# Altium schematic symbol library LimeMicroAltiumLib_schLib_r05.SchLib: 582 symbols (part 4 of 13) (continued)
## 5CGXFC7D7F31C8N (continued)
part I pins: AB3 GXB_TX_L2n (out), AB4 GXB_TX_L2p (out), AC1 GXB_RX_L2n, GXB_REFCLK_L2n (in), AC2 GXB_RX_L2p, GXB_REFCLK_L2p (in), AD3 GXB_TX_L1n (out), AD4 GXB_TX_L1p (out), AE1 GXB_RX_L1n, GXB_REFCLK_L1n (in), AE2 GXB_RX_L1p, GXB_REFCLK_L1p (in), AF3 GXB_TX_L0n (out), AF4 GXB_TX_L0p (out), AG1 GXB_RX_L0n, GXB_REFCLK_L0n (in), AG2 GXB_RX_L0p, GXB_REFCLK_L0p (in), W7 REFCLK0Ln (in), W8 REFCLK0Lp (in)
part J pins: AA1 GXB_RX_L3n, GXB_REFCLK_L3n (in), AA2 GXB_RX_L3p, GXB_REFCLK_L3p (in), R7 REFCLK1Ln (in), R8 REFCLK1Lp (in), T3 GXB_TX_L5n (out), T4 GXB_TX_L5p (out), U1 GXB_RX_L5n, GXB_REFCLK_L5n (in), U2 GXB_RX_L5p, GXB_REFCLK_L5p (in), V3 GXB_TX_L4n (out), V4 GXB_TX_L4p (out), W1 GXB_RX_L4n, GXB_REFCLK_L4n (in), W2 GXB_RX_L4p, GXB_REFCLK_L4p (in), Y3 GXB_TX_L3n (out), Y4 GXB_TX_L3p (out)
part K pins: K3 GXB_TX_L8n (out), K4 GXB_TX_L8p (out), L1 GXB_RX_L8n, GXB_REFCLK_L8n (in), L2 GXB_RX_L8p, GXB_REFCLK_L8p (in), M3 GXB_TX_L7n (out), M4 GXB_TX_L7p (out), N1 GXB_RX_L7n, GXB_REFCLK_L7n (in), N2 GXB_RX_L7p, GXB_REFCLK_L7p (in), N7 REFCLK2Ln (in), P3 GXB_TX_L6n (out), P4 GXB_TX_L6p (out), P8 REFCLK2Lp (in), R1 GXB_RX_L6n, GXB_REFCLK_L6n (in), R2 GXB_RX_L6p, GXB_REFCLK_L6p (in)
part L pins: AA7 nCSO, DATA4 (out), AB7 AS_DATA3, DATA3 (io), AC7 TCK (in), AE5 AS_DATA1, DATA1 (io), AE7 AS_DATA2, DATA2 (io), AG5 AS_DATA0, ASDO, DATA0 (io), C5 nCONFIG (in), G5 MSEL2 (in), H6 nCE (in), K7 nSTATUS (io), L8 CONF_DONE (io), M7 MSEL4 (in), P7 MSEL3 (in), P9 MSEL1 (in), T7 DCLK (io), T8 MSEL0 (in), U7 TDI (in), V7 TMS (in), W9 TDO (out)
part M pins: A7 VCCIO8A (power), A22 VCCIO7A (power), AA12 VCCIO3B (power), AA22 VCCIO5A (power), AB15 VCCIO4A (power), AB25 VCCIO5A (power), AC8 VCCIO3A (power), AC18 VCCIO4A (power), AC28 VCCIO5B (power), AD11 VCCIO3A (power), AD21 VCCIO4A (power), AE14 VCCIO3B (power), AE24 VCCIO5A (power), AF17 VCCIO4A (power), AF27 VCCIO5A (power), AG10 VCCIO3B (power), AG20 VCCIO4A (power), AG30 VCCIO5B (power), AH13 VCCIO3B (power), AH23 VCCIO4A (power), AJ16 VCCIO4A (power), AJ26 VCCIO4A (power), AK4 VCCIO3B (power), AK9 VCCIO3B (power), AK19 VCCIO4A (power), B5 VCCIO8A (power), B15 VCCIO7A (power), B25 VCCIO7A (power), C8 VCCIO8A (power), C18 VCCIO7A (power), C28 VCCIO6A (power), D11 VCCIO8A (power), D21 VCCIO7A (power), E14 VCCIO8A (power), E24 VCCIO7A (power), F7 VCCIO8A (power), F17 VCCIO7A (power), F27 VCCIO6A (power), G10 VCCIO8A (power), G20 VCCIO7A (power), G30 VCCIO6A (power), H13 VCCIO8A (power), H23 VCCIO7A (power), J16 VCCIO8A (power), J26 VCCIO6A (power), K19 VCCIO7A (power), K29 VCCIO6A (power), L12 VCCIO8A (power), L22 VCCIO6A (power), M13 VCC (power), M15 VCC (power), M17 VCC (power), M19 VCC (power), M25 VCCIO6A (power), N14 VCC (power), N16 VCC (power), N18 VCC (power), N28 VCCIO6A (power), P13 VCC (power), P15 VCC (power), P17 VCC (power), P19 VCC (power), P21 VCCIO6A (power), R14 VCC (power), R16 VCC (power), R18 VCC (power), R24 VCCIO6A (power), T13 VCC (power), T15 VCC (power), T17 VCC (power), T19 VCC (power), T27 VCCIO5B (power), U10 VCCIO3A (power), U14 VCC (power), U16 VCC (power), U18 VCC (power), U20 VCC (power), U30 VCCIO5B (power), V13 VCC (power), V15 VCC (power), V17 VCC (power), V19 VCC (power), W14 VCC (power), W16 VCC (power), W18 VCC (power), W20 VCC (power), W26 VCCIO5B (power), Y9 VCCIO3A (power), Y19 VCCIO4A (power), Y29 VCCIO5B (power)
part N pins: AA5 VCCE_GXBL (power), AB6 VCCH_GXBL (power), AB11 VCCPD3A (power), AB23 VCCA_FPLL (power), AB24 VCCPGM (power), AC5 VCCL_GXBL (power), AC10 VCC_AUX (power), AC11 VCCPGM (power), AC12 VCCPD3B4A (power), AC16 VCC_AUX (power), AC17 VCCPD3B4A (power), AC20 VCCPD3B4A (power), AC25 VREFB5AN0 (power), AD6 VCCE_GXBL (power), AD10 VCCPD3A (power), AD15 VCCPD3B4A (power), AD22 VCC_AUX (power), AE8 VREFB3AN0 (power), AE11 VCCPD3B4A (power), AE21 VCCPD3B4A (power), AH16 VREFB4AN0 (power), AJ13 VREFB3BN0 (power), B9 VREFB8AN0 (power), B16 VREFB7AN0 (power), D24 VCCPD7A8A (power), F10 VCCPGM (power), F11 VCCPD7A8A (power), F21 VCCPD7A8A (power), F23 VCCPD7A8A (power), G11 VCC_AUX (power), G13 VCCPD7A8A (power), G16 VCCPD7A8A (power), G19 VCCPD7A8A (power), H10 VCCBAT (power), H16 VCC_AUX (power), H22 VCC_AUX (power), J5 VCCE_GXBL (power), J8 VCCA_FPLL (power), J24 VCCA_FPLL (power), K6 VCCH_GXBL (power), K23 VCCPD6A (power), L5 VCCL_GXBL (power), M6 VCCE_GXBL (power), M24 VCCPD6A (power), M26 VREFB6AN0 (power), N5 VCCE_GXBL (power), P6 VCCH_GXBL (power), P24 VCCPD6A (power), P27 VREFB5BN0 (power), R5 VCCL_GXBL (power), T6 VCCE_GXBL (power), T26 VCCPD5B (power), U5 VCCE_GXBL (power), U24 VCCPD5B (power), V6 VCCH_GXBL (power), W5 VCCL_GXBL (power), W23 VCCPD5A (power), W25 VCCPD5A (power), Y6 VCCE_GXBL (power), Y8 VCCA_FPLL (power)
part O pins: A12 GND (power), A17 GND (power), A27 GND (power), AA3 GND (power), AA4 GND (power), AA6 GND (power), AA17 GND (power), AA27 GND (power), AB1 GND (power), AB2 GND (power), AB5 GND (power), AB10 GND (power), AB20 GND (power), AB30 GND (power), AC3 GND (power), AC4 GND (power), AC6 GND (power), AC13 GND (power), AC23 GND (power), AD1 GND (power), AD2 GND (power), AD5 GND (power), AD7 GND (power), AD16 GND (power), AD26 GND (power), AE3 GND (power), AE4 GND (power), AE6 GND (power), AE9 GND (power), AE19 GND (power), AE29 GND (power), AF1 GND (power), AF2 GND (power), AF5 GND (power), AF12 GND (power), AF22 GND (power), AG3 GND (power), AG4 GND (power), AG15 GND (power), AG25 GND (power), AH1 GND (power), AH2 GND (power), AH3 GND (power), AH8 GND (power), AH18 GND (power), AH28 GND (power), AJ6 GND (power), AJ11 GND (power), AJ21 GND (power), AK2 GND (power), AK14 GND (power), AK24 GND (power), AK29 GND (power), B1 GND (power), B2 GND (power), B10 GND (power), B20 GND (power), B30 GND (power), C2 GND (power), C3 GND (power), C4 GND (power), C13 GND (power), C23 GND (power), D1 GND (power), D2 GND (power), D5 GND (power), D16 GND (power), D26 GND (power), E3 GND (power), E4 GND (power), E5 GND (power), E9 GND (power), E19 GND (power), E29 GND (power), F1 GND (power), F2 GND (power), F5 GND (power), F12 GND (power), F22 GND (power), G3 GND (power), G4 GND (power), G15 GND (power), G24 GND (power), G25 GND (power), H1 GND (power), H2 GND (power), H5 GND (power), H8 GND (power), H11 GND (power), H18 GND (power), H28 GND (power), J3 GND (power), J4 GND (power), J6 GND (power), J11 GND (power), J21 GND (power), K1 GND (power), K2 GND (power), K5 GND (power), K9 GND (power), K14 GND (power), K24 GND (power), L3 GND (power), L4 GND (power), L6 GND (power), L17 GND (power), L27 GND (power), M1 GND (power), M2 GND (power), M5 GND (power), M10 GND (power), M14 GND (power), M16 GND (power), M18 GND (power), M20 GND (power), M30 GND (power), N3 GND (power), N4 GND (power), N6 GND (power), N8 GND (power), N13 GND (power), N15 GND (power), N17 GND (power), N19 GND (power), N23 GND (power), P1 GND (power), P2 GND (power), P5 GND (power), P11 GND (power), P14 GND (power), P16 GND (power), P18 GND (power), P26 GND (power), R3 GND (power), R4 GND (power), R6 GND (power), R9 GND (power), R13 GND (power), R15 GND (power), R17 GND (power), R19 GND (power), R29 GND (power), T1 GND (power), T2 GND (power), T5 GND (power), T12 GND (power), T14 GND (power), T16 GND (power), T18 GND (power), T20 GND (power), T22 GND (power), U3 GND (power), U4 GND (power), U6 GND (power), U13 GND (power), U15 GND (power), U17 GND (power), U19 GND (power), U25 GND (power), V1 GND (power), V2 GND (power), V5 GND (power), V8 GND (power), V14 GND (power), V16 GND (power), V18 GND (power), V20 GND (power), V23 GND (power), V28 GND (power), W3 GND (power), W4 GND (power), W6 GND (power), W11 GND (power), W13 GND (power), W15 GND (power), W17 GND (power), W19 GND (power), W21 GND (power), Y1 GND (power), Y2 GND (power), Y5 GND (power), Y7 GND (power), Y14 GND (power), Y24 GND (power)
part P pins: AD8 DNU, AD14 DNU, B3 DNU, B4 DNU, C1 RREF_TL, D3 NC, D4 NC, D15 DNU, E1 NC, E2 NC, F3 NC, F4 NC, F24 DNU, G1 NC, G2 NC, H3 NC, H4 NC, J1 NC, J2 NC, K8 NC, L7 NC
part A text: BANK 3A
part B text: BANK 3B
part C text: BANK 4A
part D text: BANK 5A
part E text: BANK 5B
part F text: BANK 6A
part G text: BANK 7A
part H text: BANK 8A

## 8X_resistor_array_0402
designator R?, comment ResistorArray_0402
Manufacturer: PANASONIC ELECTRONIC COMPONENTS; Manufacturer Part Number: EXB2HV510JV; Supplier: Farnell; Supplier Part Number 1: 2060069RL
footprint EXB2HV (Chip Array, Flat, 16-Leads, Pitch 0,50mm,  Body 3,80x1,60mm,  IPC Medium Density)
pins: 1, 2, 3, 4, 5, 6, 7, 8, 9, 10, 11, 12, 13, 14, 15, 16

## 10M16SAU169C8G
designator IC?
Manufacturer: Altera; Number of LABs/CLBs: 1000; Number of Logic Elements/Cells: 16000; Total RAM Bits: 562176; Number of I/O: 130; Voltage - Supply: 2.85 V ~ 3.465 V; Supplier 1: Digi-Key; RoHS: RoHS Compliant; Number of Gates: -; Mounting Type: Surface Mount; Operating Temperature: 0°C ~ 85°C (TJ); Package / Case: 169-LFBGA; Supplier Device Package: 169-UBGA (11x11); Category: Integrated Circuits (ICs); Manufacturer Part Number 1: 10M16SAU169C8G; Supplier Part Number 1: 544-3110-ND
footprint 10M16SAU169C8G (BGA, 169-Leads, Body 11,00x11,00mmx1,55mm, Pitch 0,80mm)
part A pins: B1 DIFFOUT_L5p (io), C1 DIFFOUT_L5n (io), C2 DIFFOUT_L1p (io), D1 DIFFOUT_L1n (io), E1 DIFFOUT_L7p (io), E3 DIFFOUT_L3n (io), E4 DIFFOUT_L3p (io), E5 JTAGEN (io), F1 DIFFOUT_L7n (io), F4 DIFFOUT_L14n (io), F5 TDI, DIFFOUT_L12n (io), F6 TDO, DIFFOUT_L12p (io), G1 TMS, DIFFOUT_L11n (io), G2 TCK, DIFFOUT_L11p (io), G4 DIFFOUT_L14p (io), H1 I/O (io), H2 DIFFOUT_L16n (io), H3 DIFFOUT_L16p (io)
part B pins: G5 CLK0n, DIFFOUT_L20n (io), H4 CLK1p, DIFFOUT_L22p (io), H5 CLK1n, DIFFOUT_L22n (io), H6 CLK0p, DIFFOUT_L20p (io), J1 DIFFOUT_L21n (io), J2 DIFFOUT_L21p (io), K1 DIFFOUT_L32n (io), K2 DIFFOUT_L32p (io), L1 I/O (io), L2 I/O (io), L3 PLL_L_CLKOUTp, DIFFOUT_L31p (io), M1 DIFFOUT_L23n (io), M2 DIFFOUT_L23p (io), M3 PLL_L_CLKOUTn, DIFFOUT_L31n (io), N2 DPCLK0, DIFFOUT_L24n (io), N3 DPCLK1, DIFFOUT_L24p (io)
part C pins: J5 DIFFOUT_B3p (io), J6 DIFFOUT_B13n (io), J7 DIFFOUT_B15n (io), J8 CLK7n, DIFFOUT_B20n (io), K5 DIFFOUT_B3n (io), K6 DIFFOUT_B13p (io), K7 DIFFOUT_B15p (io), K8 CLK7p, DIFFOUT_B20p (io), L4 DIFFOUT_B1p (io), L5 DIFFOUT_B1n (io), L10 DIFFOUT_B22p (io), L11 CLK6p, DIFFOUT_B18p (io), M4 DIFFOUT_B2n (io), M5 DIFFOUT_B2p (io), M7 DIFFOUT_B5p (io), M8 DIFFOUT_B14n (io), M9 DIFFOUT_B14p (io), M10 DIFFOUT_B22n (io), M11 CLK6n, DIFFOUT_B18n (io), M12 DIFFOUT_B16p (io), M13 DIFFOUT_B16n (io), N4 DIFFOUT_B4n (io), N5 DIFFOUT_B4p (io), N6 DIFFOUT_B5n (io), N7 DIFFOUT_B6n (io), N8 DIFFOUT_B6p (io), N9 DIFFOUT_B17p (io), N10 DIFFOUT_B17n (io), N11 I/O (io), N12 I/O (io)
part D pins: G12 DIFFOUT_R15n (io), G13 DIFFOUT_R15p (io), H8 DIFFOUT_R14n (io), H9 DIFFOUT_R14p (io), H10 DIFFOUT_R12n (io), H13 DIFFOUT_R13n (io), J9 DIFFOUT_R12p (io), J10 DIFFOUT_R1n, RDN (io), J12 DIFFOUT_R11n (io), J13 DIFFOUT_R13p (io), K10 DIFFOUT_R1p, RUP (io), K11 DIFFOUT_R2p (io), K12 DIFFOUT_R11p (io), K13 I/O (io), L12 DIFFOUT_R2n (io), L13 I/O (io)
part E pins: A12 DIFFOUT_R34n (io), B11 DIFFOUT_R32n (io), B12 DIFFOUT_R32p (io), B13 DIFFOUT_R34p (io), C11 DIFFOUT_R33n (io), C12 DIFFOUT_R33p (io), C13 I/O (io), D9 DIFFOUT_R35n (io), D11 DIFFOUT_R37n (io), D12 DIFFOUT_R37p (io), D13 I/O (io), E9 DIFFOUT_R31n (io), E10 DIFFOUT_R35p (io), E12 DIFFOUT_R22n (io), E13 CLK3n, DIFFOUT_R20n (io), F8 DIFFOUT_R31p (io), F9 DPCLK3, DIFFOUT_R30p (io), F10 DPCLK2, DIFFOUT_R30n (io), F12 DIFFOUT_R22p (io), F13 CLK3p, DIFFOUT_R20p (io), G9 CLK2p, DIFFOUT_R18p (io), G10 CLK2n, DIFFOUT_R18n (io)
part F pins: A2 DIFFOUT_T38p (io), A3 DIFFOUT_T33n (io), A4 DIFFOUT_T33p (io), A5 I/O (io), A6 DIFFOUT_T31n (io), A7 DIFFOUT_T31p (io), A8 DIFFOUT_T27p (io), A9 DIFFOUT_T27n (io), A10 DIFFOUT_T29p (io), A11 DIFFOUT_T29n (io), B2 DIFFOUT_T38n (io), B3 DIFFOUT_T35p (io), B4 DIFFOUT_T35n (io), B5 DIFFOUT_T32n (io), B6 DIFFOUT_T32p (io), B7 VREFB8N0 (io), B9 DEV_CLRn, DIFFOUT_T28n (io), B10 DIFFOUT_T28p (io), C4 nSTATUS, DIFFOUT_T36p (io), C5 CONF_DONE, DIFFOUT_T36n (io), C9 CLK5n, DIFFOUT_T26n (io), C10 CLK5p, DIFFOUT_T26p (io), D6 CRC_ERROR, DIFFOUT_T34n (io), D7 CONFIG_SEL (io), D8 DEV_OE, DIFFOUT_T30p (io), E6 DIFFOUT_T34p (io), E7 nCONFIG (in), E8 DIFFOUT_T30n (io)
part G pins: A1 GND, A13 GND, B8 GND, C3 GND, D5 GND, E2 REFGND, E11 GND, F3 GND, G7 GND, H12 GND, J4 GND, L9 GND, M6 GND, N1 GND, N13 GND
part H pins: C6 VCCIO8, C7 VCCIO8, C8 VCCIO8, D2 ANAIN1, D3 ADC_VREF, D4 VCCA3, D10 VCCA2, F2 VCCIO1A, F7 VCC_ONE, F11 VCCIO6, G3 VCCIO1B, G6 VCC_ONE, G8 VCC_ONE, G11 VCCIO6, H7 VCC_ONE, H11 VCCIO5, J3 VCCIO2, J11 VCCIO5, K3 VCCIO2, K4 VCCA1, K9 VCCA4, L6 VCCIO3, L7 VCCIO3, L8 VCCIO3
part A text: BANK 1A; BANK 1B
part B text: BANK 2
part C text: BANK 3
part D text: BANK 5
part E text: BANK 6
part F text: BANK 8
part G text: GND BANK

## 12CWQ06FN_diode_array
designator D?, comment 12CWQ06FN
Part Description: Diode Array 1 Pair Common Cathode Schottky 60 V Surface Mount TO-252-3, DPak (2 Leads + Tab), SC-63; Manufacturer: Sangdest Microelectronics; Supplier 1: Digi-Key; Supplier Part Number 1: 1655-12CWQ06FNCT-ND; Manufacturer Part Number 1: 12CWQ06FN; Stock 1: 56408; Pricing 1: 1=0,70000, 10=0,61700, 100=0,47270, 500=0,37364, 1000=0,29892 (USD); RoHS: No
footprint 12CWQ06FN_diode_array_DPAK (Footprint not found)
pins: 1, 2, 3

## 12V_DC_FAN
designator FAN?, comment 12V DC FAN
Part Description: DC Fans DC FAN 60x20mm 12VDC Sleeve WIRE; Manfufacturer Part Number 1: FAD1-06020CSAW11; Manufacturer: Qualtek; .Checked PCB: AV; Supplier Part Number 1: 562-FAD1-06020CSAW11; Supplier 1: Mouser
footprint LD39100PUR
pins: 1 STANDS

## 24FC64F
designator IC?
Manufacturer Part Number 1: 24FC64F-I/ST; Manufacturer: Microchip Technology; Format - Memory: EEPROMs - Serial; Speed: 400kHz, 1MHz; Interface: I²C, 2-Wire Serial; Memory Type: EEPROM; Memory Size: 64K (8K x 8); Voltage - Supply: 1.7 V ~ 5.5 V; Supplier 1: Digi-Key; Packaging: Tube; Supplier Device Package: 8-TSSOP; Operating Temperature: -40°C ~ 85°C; RoHS: RoHS Compliant; Category: Integrated Circuits (ICs); Package / Case: 8-TSSOP (0.173", 4.40mm Width); Supplier Part Number 1: 24FC64F-I/ST-ND
footprint QPB9337_QFN32 (Footprint not found)
pins: 1 A0, 2 A1, 3 A2, 4 VSS, 5 SDA, 6 SCL, 7 WP, 8 VCC

## 24FC512
designator IC?
Manufacturer Part Number 1: 24FC512-I/ST; Manufacturer: Microchip Technology; Speed: 400kHz, 1MHz; Memory Type: EEPROM; Memory Size: 512K (64K x 8); Voltage - Supply: 1.7 V ~ 5.5 V; Interface: I²C, 2-Wire Serial; Format - Memory: EEPROMs - Serial; Supplier 1: Digi-Key; RoHS: RoHS Compliant; Packaging: Tube; Operating Temperature: -40°C ~ 85°C; Supplier Device Package: 8-TSSOP; Category: Integrated Circuits (ICs); Package / Case: 8-TSSOP (0.173", 4.40mm Width); Supplier Part Number 1: 24FC512-I/ST-ND
footprint ESD8472_X3DFN2
pins: 1 A0, 2 A1, 3 A2, 4 VSS, 5 SDA, 6 SCL, 7 WP, 8 VCC

## 74AHCT1G126SE-7_BUFFER_NON_INV
designator IC?, comment 74AHCT1G126SE-7
74LVC1G07SE-7 alternative; Part Description: Buffer, Non-Inverting 1 Element 1 Bit per Element 3-State Output SOT-353; Manufacturer: Diodes; Min Supply Voltage: 4.5V; Max Supply Voltage: 5.5V; Operating Supply Voltage: 5V; Number of Channels: 1; Propagation Delay: 11ns; Logic Function: Buffer,Inverting; Polarity: Non-Inverting; Low Level Output Current: 8mA; Operating Supply Current: 10uA; High Level Output Current: -8mA; Quiescent Current: 1uA; Output Type: 3-STATE,PUSH-PULL; Supplier 1: Digi-Key; Supplier Part Number 1: 74AHCT1G126SE-7DICT-ND; Manufacturer Part Number 1: 74AHCT1G126SE-7; Stock 1: 127290; Pricing 1: 1=0,27000, 10=0,22200, 25=0,18600, 100=0,11780, 250=0,09096, 500=0,07752, 1000=0,05271 (USD); RoHS: Yes; Mount: Surface Mount; Case/Package: SOT-353; Number of Pins: 5; Contact Plating: Tin,Matte; Min Operating Temperature: -40°C; Max Operating Temperature: 125°C; Number of Inputs: 1; Number of Outputs: 1; Packaging: Tape and Reel; Package Quantity: 3000; Number of Elements: 1; Number of Input Lines: 1; Number of Output Lines: 1; Number of Bits per Element: 1; Turn-On Delay Time: 11ns; Series: 74AHCT; Number of Functions: 1; Supply Voltage-Nom: 5.5V; Technology: CMOS; Radiation Hardening: No; REACH SVHC: No SVHC; Lead Free: Lead Free; RoHS Compliant: Yes; ComponentLink1URL: https://datasheet.ciiva.com/12256/74ahct1g126-80154-12256741.pdf?src-supplier=Mouser; ComponentLink1Description: https://datasheet.ciiva.com/12256/74ahct1g126-80154-12256741.pdf?src-supplier=Mouser; ComponentLink2URL: https://datasheet.ciiva.com/26949/getdatasheetpartid-792439-26949318.pdf?src-supplier=Verical; ComponentLink2Description: https://datasheet.ciiva.com/26949/getdatasheetpartid-792439-26949318.pdf?src-supplier=Verical; ComponentLink3URL: https://datasheet.ciiva.com/1832/74ahct1g126-1832523.pdf?src-supplier=Digi-Key; ComponentLink3Description: https://datasheet.ciiva.com/1832/74ahct1g126-1832523.pdf?src-supplier=Digi-Key; ComponentLink4URL: https://datasheet.ciiva.com/1832/74ahct1g126-1832524.pdf?src-supplier=Digi-Key; ComponentLink4Description: https://datasheet.ciiva.com/1832/74ahct1g126-1832524.pdf?src-supplier=Digi-Key; ComponentLink5URL: https://datasheet.ciiva.com/1154/74ahct1g126-1154309.pdf?src-supplier=Element14; ComponentLink5Description: https://datasheet.ciiva.com/1154/74ahct1g126-1154309.pdf?src-supplier=Element14
footprint 74AHCT1G126SE-7_BUFFER_SOT353
pins: 1 ON/NC (in), 2 A (in), 3 GND, 4 Y (out), 5 VCC (power)

## 74HC595BQ,115
designator IC?
Part Description: C 8BIT SHIFT REGISTER 16-DHVQFN; Manufacturer: Nexperia USA Inc.; Logic Type: Shift Register; Output Type: Tri-State; Number of Bits per Element: 8; Function: Serial to Parallel, Serial; Voltage - Supply: 2 V ~ 6 V; Supplier 1: Digi-Key; Manufacturer Part Number 1: 74HC595BQ,115; RoHS: RoHS Compliant; Category: Integrated Circuits (ICs); Stock 1: 15449; Pricing 1: 1=0.39, 10=0.32, 100=0.2175, 500=0.16316, 1000=0.12236 (USD); Packaging: Cut Tape (CT); Part Status: Active; Operating Temperature: -40°C ~ 125°C; Mounting Type: Surface Mount; Package / Case: 16-VFQFN Exposed Pad; Supplier Device Package: 16-DHVQFN (2.5x3.5); ComponentLink1URL: http://assets.nexperia.com/documents/data-sheet/74HC_HCT595.pdf; ComponentLink1Description: http://assets.nexperia.com/documents/data-sheet/74HC_HCT595.pdf; Supplier Part Number 1: 1727-3327-1-ND
footprint 74HC595BQ,115
pins: 1 Q1 (out), 2 Q2 (out), 3 Q3 (out), 4 Q4 (out), 5 Q5 (out), 6 Q6 (out), 7 Q7 (out), 8 GND, 9 Q7S (out), 10 ~{MR} (in), 11 SHCP (in), 12 STCP (in), 13 ~{OE} (in), 14 DS (in), 15 Q0 (out), 16 VCC (power), PAD

## 74LVC1G3157FZ4_SPDT_SW
designator IC?, comment 74LVC1G3157FZ4
Part Description: 1 Circuit IC Switch 2:1 10Ohm X2-DFN1410-6; Manufacturer: Diodes; Manufacturer Part Number 1: 74LVC1G3157FZ4-7; Number of Circuits: 1; On-State Resistance: 10R; -3db Bandwidth: 300MHz; Supplier 1: Digi-Key; Supplier Part Number 1: 74LVC1G3157FZ4-7DICT-ND; Stock 1: 158709; Pricing 1: 1=0,42000, 10=0,31200, 25=0,27320, 100=0,17670, 250=0,14628, 500=0,11702, 1000=0,08972, 2500=0,07802 (USD); RoHS: Yes; Number of Pins: 6; Min Operating Temperature: -40°C; Max Operating Temperature: 125°C; Packaging: Tape and Reel; RoHS Compliant: Yes; ComponentLink1URL: https://www.diodes.com/assets/Datasheets/74LVC1G3157.pdf?src-supplier=Digi-Key; ComponentLink1Description: https://www.diodes.com/assets/Datasheets/74LVC1G3157.pdf?src-supplier=Digi-Key; ComponentLink2URL: https://www.diodes.com/assets/product-showcases/74LVC3157-NPA-0516.pdf?src-supplier=Digi-Key; ComponentLink2Description: https://www.diodes.com/assets/product-showcases/74LVC3157-NPA-0516.pdf?src-supplier=Digi-Key
footprint 74LVC1G3157FZ4_SPDT_SW_DFN1410-6 (Footprint not found)
pins: 1 B1, 2 GND, 3 B0, 4 A, 5 VCC, 6 SEL

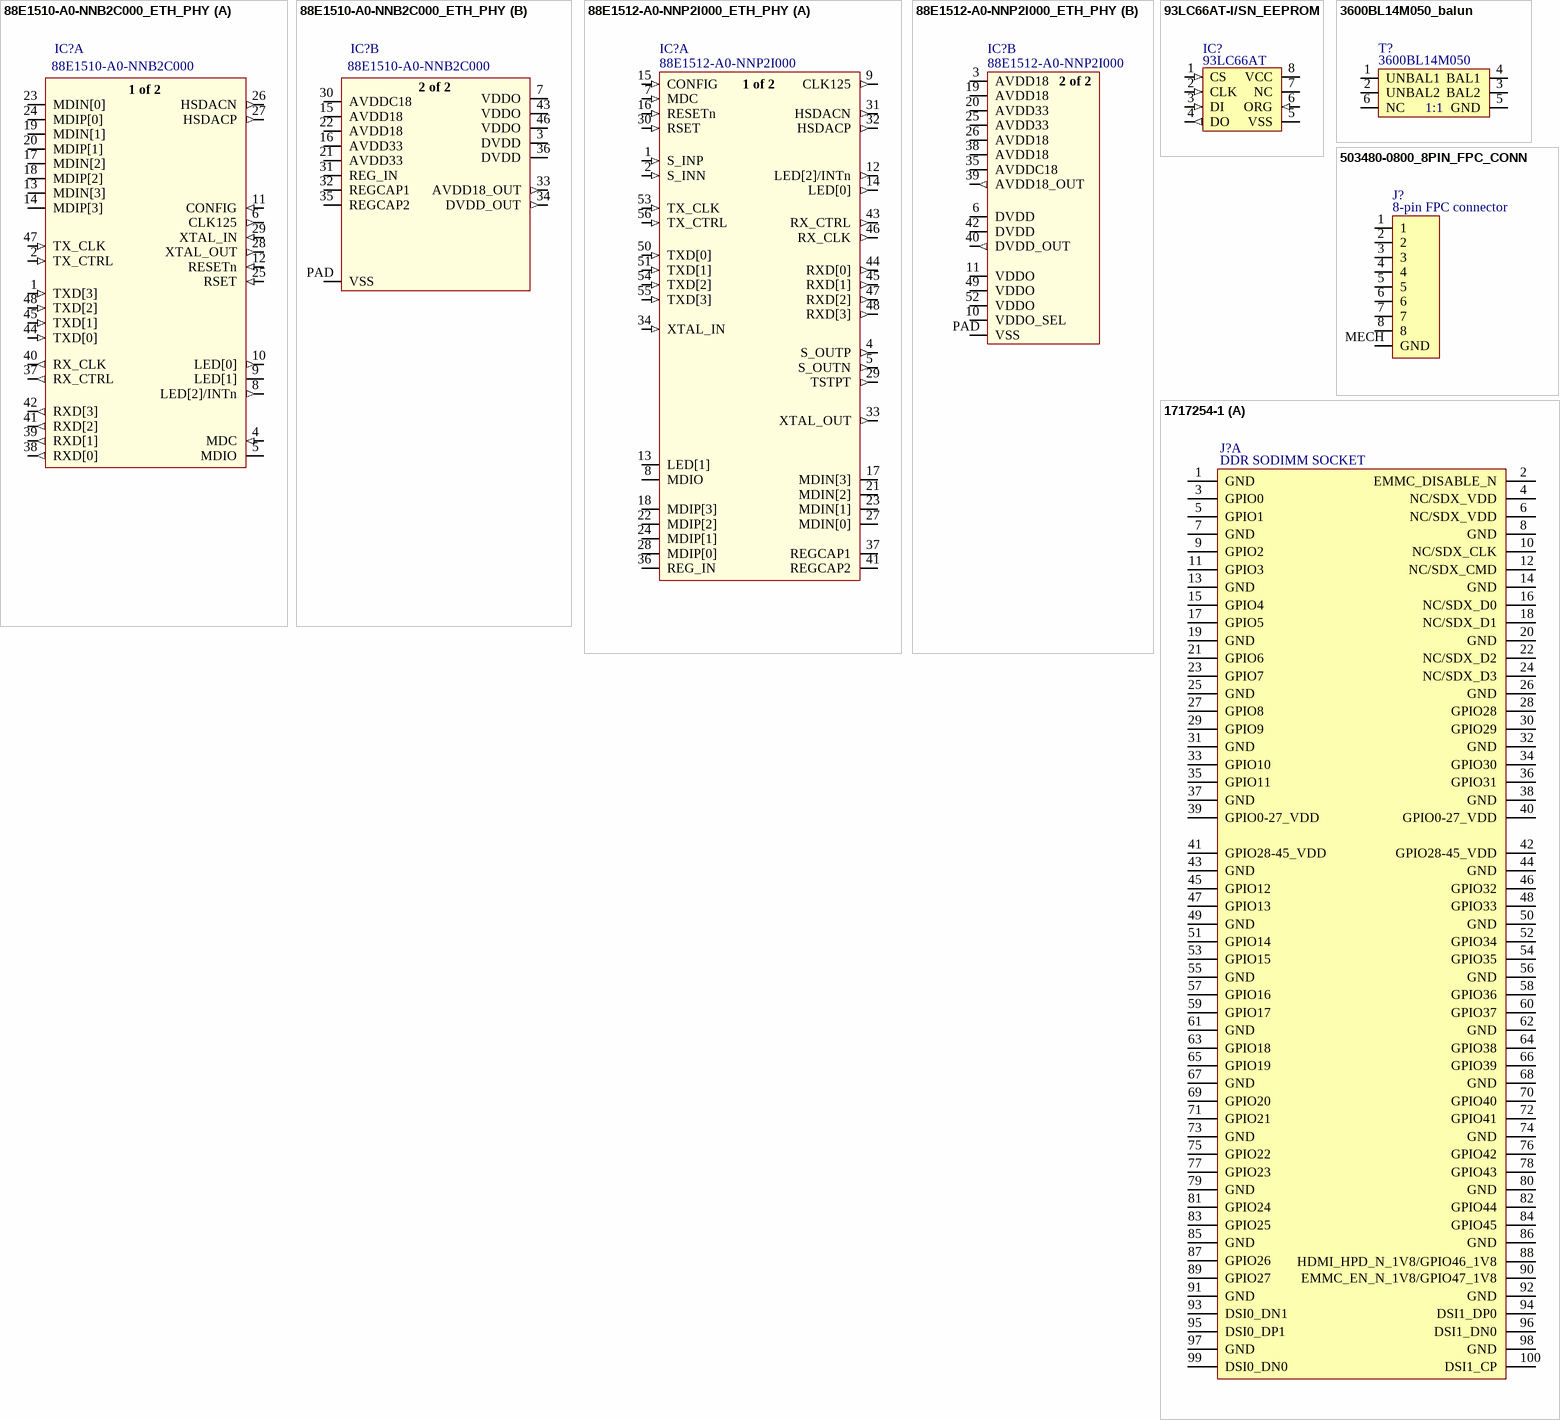
[diagram p20: symbols 88E1510-A0-NNB2C000_ETH_PHY to 1717254-1]

## 88E1510-A0-NNB2C000_ETH_PHY
designator IC?, comment 88E1510-A0-NNB2C000
Part Description: 4/4 Transceiver Full, Half IEEE 802.3, IEEE 1588 48-QFN (7x7); Manufacturer: Marvell; Supplier 1: Digi-Key; Supplier Part Number 1: 2208-88E1510-A0-NNB2C000-ND; Manufacturer Part Number 1: 88E1510-A0-NNB2C000; Stock 1: 1782; Pricing 1: 1=13,67000, 10=12,56100, 25=12,04040, 80=10,08800, 260=9,43719, 520=8,78635, 1040=8,59600 (USD); RoHS: Yes; RoHS Compliant: Yes
footprint 88E1510-A0-NNB2C000 _VQFN48 (Footprint not found)
part A pins: 1 TXD[3] (in), 2 TX_CTRL (in), 4 MDC (in), 5 MDIO (io), 6 CLK125 (out), 8 LED[2]/INTn (out), 9 LED[1] (io), 10 LED[0] (out), 11 CONFIG (in), 12 RESETn (in), 13 MDIN[3] (io), 14 MDIP[3] (io), 17 MDIN[2] (io), 18 MDIP[2] (io), 19 MDIN[1] (io), 20 MDIP[1] (io), 23 MDIN[0] (io), 24 MDIP[0] (io), 25 RSET (in), 26 HSDACN (out), 27 HSDACP (out), 28 XTAL_OUT (out), 29 XTAL_IN (in), 37 RX_CTRL (out), 38 RXD[0] (out), 39 RXD[1] (out), 40 RX_CLK (out), 41 RXD[2] (out), 42 RXD[3] (out), 44 TXD[0] (in), 45 TXD[1] (in), 47 TX_CLK (in), 48 TXD[2] (in)
part B pins: 3 DVDD (power), 7 VDDO (power), 15 AVDD18 (power), 16 AVDD33 (power), 21 AVDD33 (power), 22 AVDD18 (power), 30 AVDDC18 (power), 31 REG_IN, 32 REGCAP1 (io), 33 AVDD18_OUT (out), 34 DVDD_OUT (out), 35 REGCAP2 (io), 36 DVDD (power), 43 VDDO (power), 46 VDDO (power), PAD VSS
part A text: 1 of 2
part B text: 2 of 2

## 88E1512-A0-NNP2I000_ETH_PHY
designator IC?, comment 88E1512-A0-NNP2I000
Part Description: 4/4 Transceiver Full, Half IEEE 802.3, IEEE 1588 56-QFN (8x8); Manufacturer: Marvell; Number of Transceivers: 1; Supplier 1: Digi-Key; Supplier Part Number 1: 2208-88E1512-A0-NNP2I000-ND; Manufacturer Part Number 1: 88E1512-A0-NNP2I000; Stock 1: 6100; Pricing 1: 1=22,08000, 10=20,29400, 25=19,45320, 80=16,29850, 260=15,24704, 520=14,19552, 1040=13,45945 (USD); RoHS: Yes; Mount: Surface Mount; Min Operating Temperature: -40°C; Max Operating Temperature: 85°C; RoHS Compliant: Yes; ComponentLink1URL: http://www.marvell.com/transceivers/assets/Alaska_88E1512-001_product_brief.pdf?src-supplier=Avnet+Asia; ComponentLink1Description: http://www.marvell.com/transceivers/assets/Alaska_88E1512-001_product_brief.pdf?src-supplier=Avnet+Asia
footprint QFN56_MTG
part A pins: 1 S_INP (in), 2 S_INN (in), 4 S_OUTP (out), 5 S_OUTN (out), 7 MDC (in), 8 MDIO (io), 9 CLK125 (out), 12 LED[2]/INTn (out), 13 LED[1] (io), 14 LED[0] (out), 15 CONFIG (in), 16 RESETn (in), 17 MDIN[3] (io), 18 MDIP[3] (io), 21 MDIN[2] (io), 22 MDIP[2] (io), 23 MDIN[1] (io), 24 MDIP[1] (io), 27 MDIN[0] (io), 28 MDIP[0] (io), 29 TSTPT (out), 30 RSET (in), 31 HSDACN (out), 32 HSDACP (out), 33 XTAL_OUT (out), 34 XTAL_IN (in), 36 REG_IN, 37 REGCAP1 (io), 41 REGCAP2 (io), 43 RX_CTRL (out), 44 RXD[0] (out), 45 RXD[1] (out), 46 RX_CLK (out), 47 RXD[2] (out), 48 RXD[3] (out), 50 TXD[0] (in), 51 TXD[1] (in), 53 TX_CLK (in), 54 TXD[2] (in), 55 TXD[3] (in), 56 TX_CTRL (in)
part B pins: 3 AVDD18 (power), 6 DVDD (power), 10 VDDO_SEL (power), 11 VDDO (power), 19 AVDD18 (power), 20 AVDD33 (power), 25 AVDD33 (power), 26 AVDD18 (power), 35 AVDDC18 (power), 38 AVDD18 (power), 39 AVDD18_OUT (out), 40 DVDD_OUT (out), 42 DVDD (power), 49 VDDO (power), 52 VDDO (power), PAD VSS
part A text: 1 of 2
part B text: 2 of 2

## 93LC66AT-I/SN_EEPROM
designator IC?, comment 93LC66AT
Part Description: EEPROM Memory IC 4Kb (512 x 8) SPI 2MHz 8-SOIC; Manufacturer: Microchip Technology; Manufacturer Part Number 1: 93LC66AT-I/SN; Memory Type: Non-Volatile; Memory Format: EEPROM; Memory Size: 4Kb (512 x 8); Write Cycle Time - Word, Page: 6ms; Memory Interface: SPI; Voltage - Supply: 2.5 V ~ 5.5 V; Supplier 1: Digi-Key; RoHS: RoHS Compliant; Category: Integrated Circuits (ICs); Stock 1: 6857; Pricing 1: 1=0.27, 25=0.2576, 100=0.2543 (USD); Packaging: Digi-Reel®; Part Status: Active; Technology: EEPROM; Operating Temperature: -40°C ~ 85°C (TA); Mounting Type: Surface Mount; Package / Case: 8-SOIC (0.154", 3.90mm Width); Supplier Device Package: 8-SOIC; ComponentLink1URL: http://www.microchip.com/mymicrochip/filehandler.aspx?ddocname=en011819; ComponentLink1Description: http://www.microchip.com/mymicrochip/filehandler.aspx?ddocname=en011819; Supplier Part Number 1: 93LC66AT-I/SNDKR-ND
footprint SOIC127P600-8DL_v2 (8-Pin Small Outline Integrated Circuit 1.27 mm Pitch)
pins: 1 CS (in), 2 CLK (in), 3 DI (in), 4 DO (out), 5 VSS, 6 ORG (in), 7 NC, 8 VCC

## 3600BL14M050_balun
designator T?, comment 3600BL14M050
Part Description: Signal Conditioning 3.6GHz 1:1 BALUN
footprint 3600BL14M050_balun_0603
pins: 1 UNBAL1, 2 UNBAL2, 3 BAL2, 4 BAL1, 5 GND, 6 NC
text: 1:1

## 503480-0800_8PIN_FPC_CONN
designator J?, comment 8-pin FPC connector
Part Description: 8 Position FFC, FPC Connector Contacts, Top and Bottom 0.020" (0.50mm) Surface Mount, Right Angle; Manufacturer: Molex; Manufacturer Part Number 1: 503480-0800; Supplier 1: Digi-Key; Supplier Part Number 1: WM1388CT-ND; Stock 1: 119007; Pricing 1: 1=0,92000, 10=0,76100, 100=0,63420, 1000=0,50736 (USD); RoHS: Yes; ComponentLink1URL: https://datasheet.ciiva.com/671/5034800400-sd-671136.pdf?src-supplier=Digi-Key; ComponentLink1Description: https://datasheet.ciiva.com/671/5034800400-sd-671136.pdf?src-supplier=Digi-Key; ComponentLink2URL: https://datasheet.ciiva.com/5751/1631789-5751170.pdf?src-supplier=Farnell; ComponentLink2Description: https://datasheet.ciiva.com/5751/1631789-5751170.pdf?src-supplier=Farnell; ComponentLink3URL: https://datasheet.ciiva.com/10363/5034800800-ffc-fpc-connectors-10363985.pdf?src-supplier=Avnet; ComponentLink3Description: https://datasheet.ciiva.com/10363/5034800800-ffc-fpc-connectors-10363985.pdf?src-supplier=Avnet; ComponentLink4URL: https://datasheet.ciiva.com/5138/5034800800-ffc-fpc-connectors-179547-5138276.pdf?src-supplier=Mouser; ComponentLink4Description: https://datasheet.ciiva.com/5138/5034800800-ffc-fpc-connectors-179547-5138276.pdf?src-supplier=Mouser; ComponentLink5URL: https://datasheet.ciiva.com/26825/getdatasheetpartid-495673-26825585.pdf?src-supplier=Verical; ComponentLink5Description: https://datasheet.ciiva.com/26825/getdatasheetpartid-495673-26825585.pdf?src-supplier=Verical
footprint 503480-0800_8PIN_FPC_CONN (Footprint not found)
pins: 1, 2, 3, 4, 5, 6, 7, 8, MECH GND

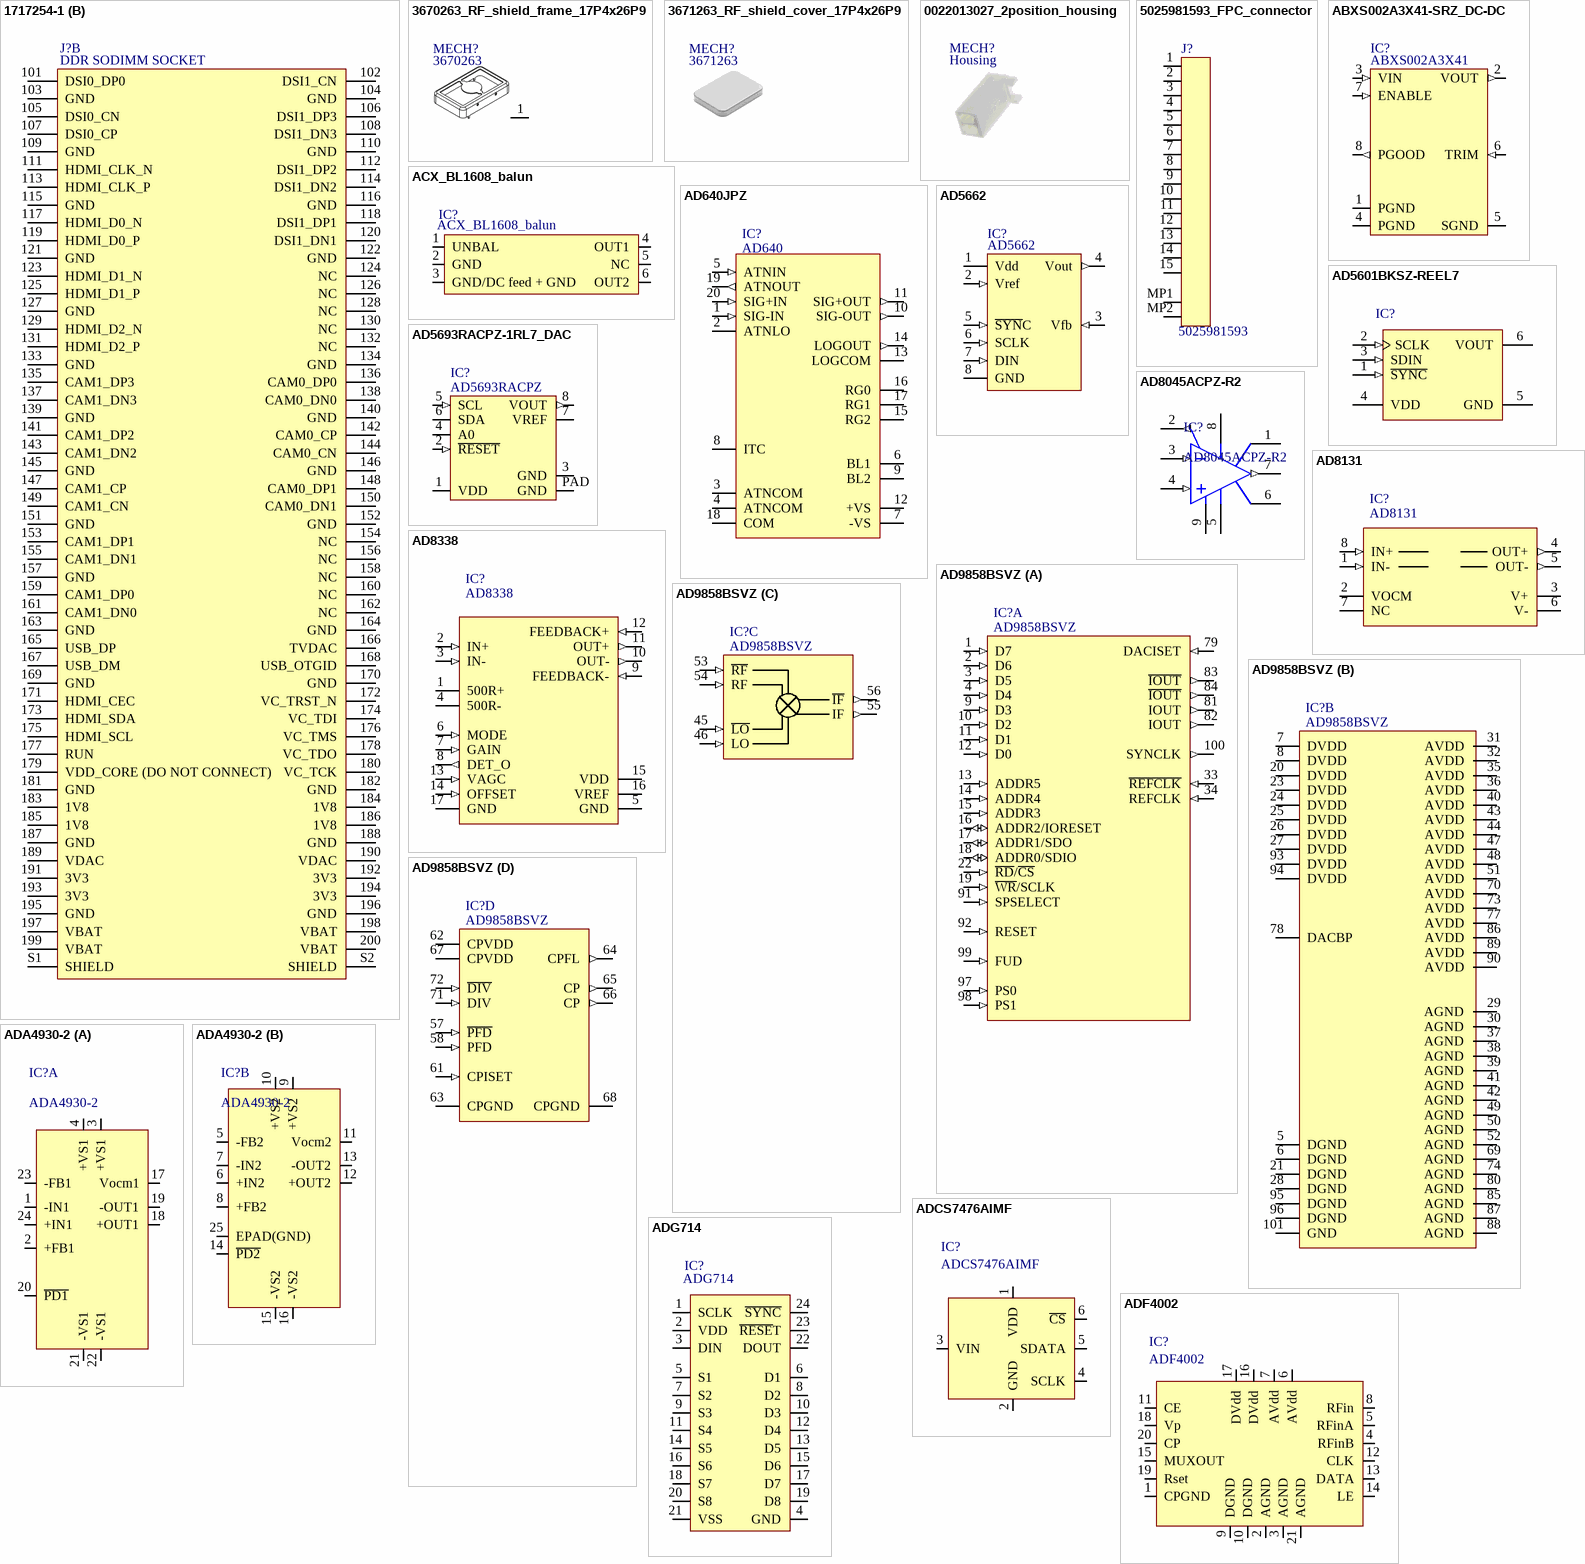
[diagram p21: symbols 1717254-1 to ADG714]